# Altium footprint library myPcb.PcbLib: 80 footprints (part 5 of 5)
Each footprint in its own frame and in the unit in brackets; x right, y up, seen from the top. Pads: shape width x height; smd on the part's side, far side on the other; paste and mask are expansions set on the pad; w line width, h text height; cw(c..) or ccw(c..) is an arc to the next point about the centre after c.
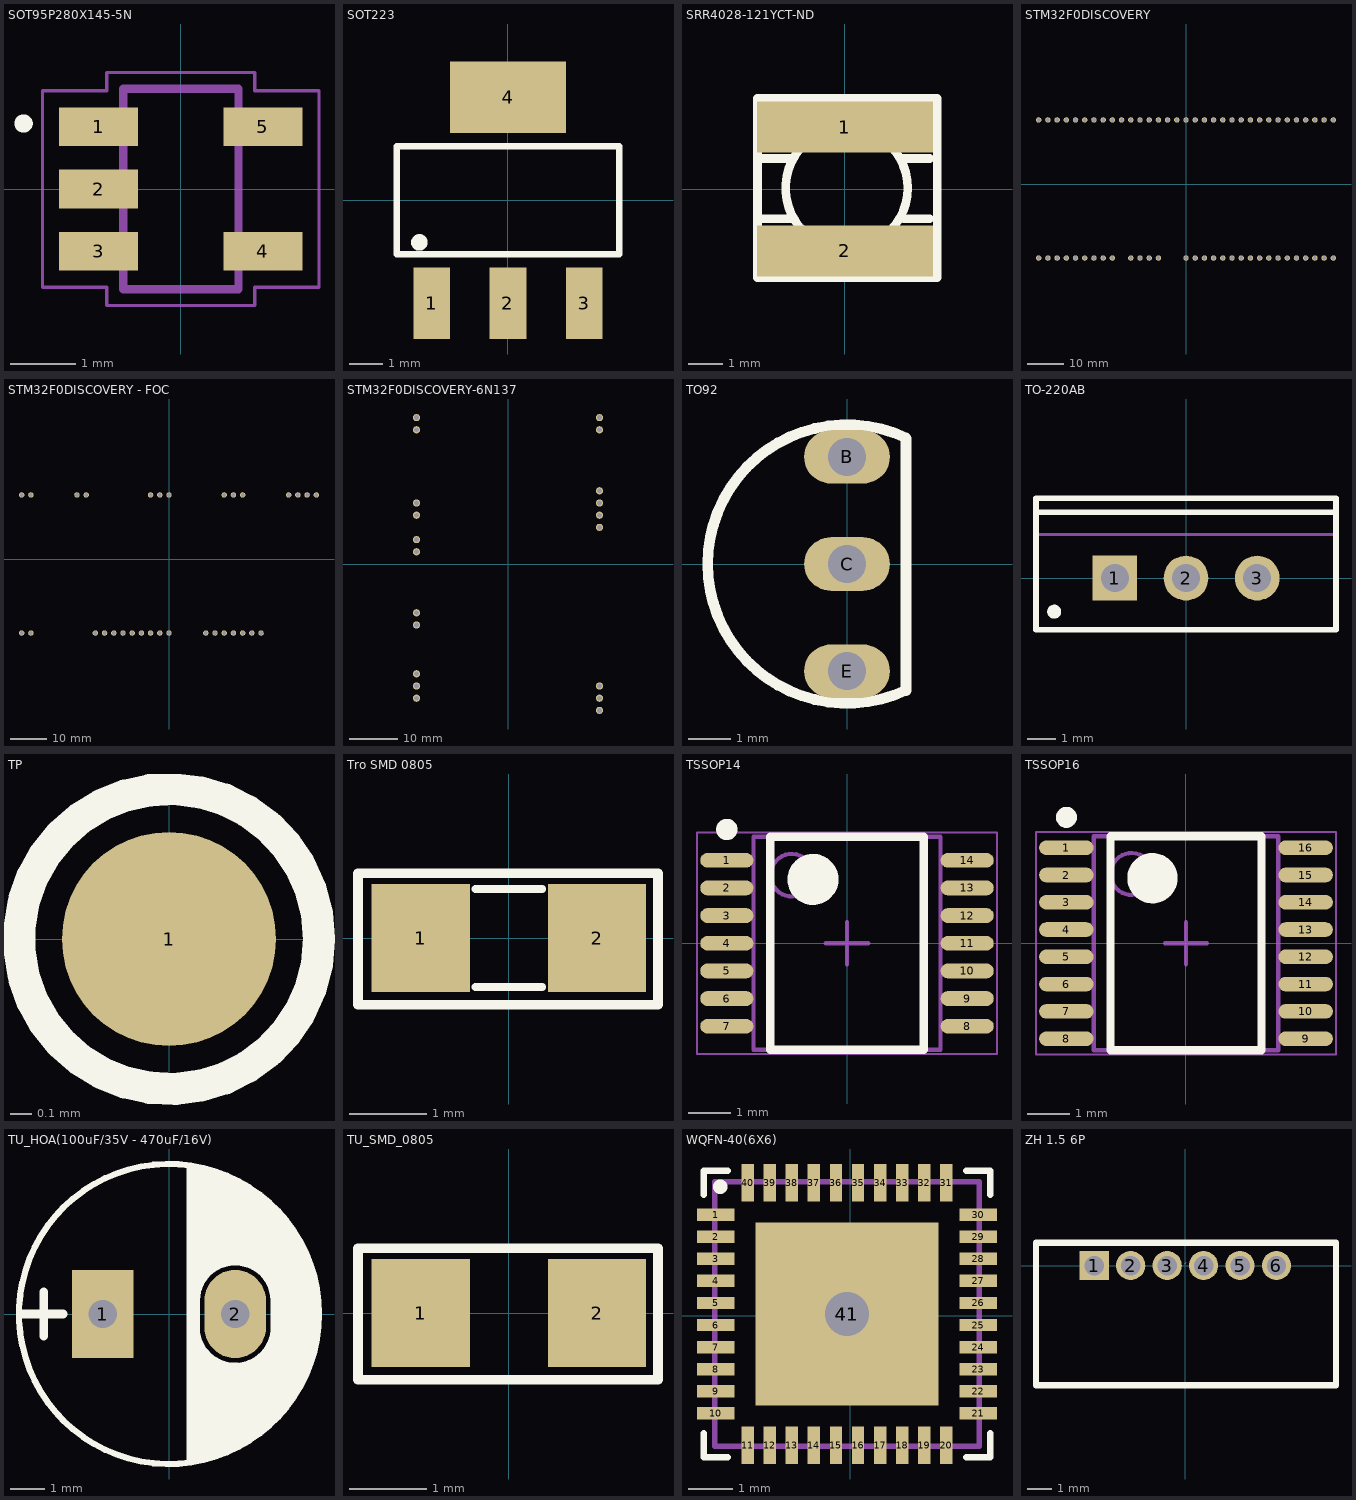
[diagram p4: the footprints below, top view; thin cyan lines are the x and y axes]

## SOT95P280X145-5N [mm]
pads (5):
  rect 1.21x0.59 smd: 1(-1.255,0.95) 2(-1.255,0) 3(-1.255,-0.95) 4(1.255,-0.95) 5(1.255,0.95)
Top Overlay:
  circle w0.14: c-2.4,1 r0.07
Mechanical 4:
  lines w0.127: -0.88,-1.53 -0.88,1.53 ; -0.88,-1.53 0.88,-1.53 ; -0.88,-1.53 -0.88,1.53 ; -0.88,-1.53 0.88,-1.53 ; -0.88,1.53 0.88,1.53 ; -0.88,1.53 0.88,1.53 ; 0.88,-1.53 0.88,1.53 ; 0.88,-1.53 0.88,1.53
Mechanical 16:
  lines w0.05: -2.11,-1.5 -2.11,1.5 -1.13,1.5 -1.13,1.78 1.13,1.78 1.13,1.5 2.11,1.5 2.11,-1.5 1.13,-1.5 1.13,-1.78 -1.13,-1.78 -1.13,-1.5 -2.11,-1.5
3D body: height 1.11, standoff 0.01, extent -1.275,-1.5 1.225,1.5

## SOT223 [mm] "SOT-223/SC-73; 4 Leads; Body 6.7 x 7.3 mm, inc. leads (LxW max)"
height 1.8
pads (4):
  rect 1.1x2.15 smd: 1(-2.3,-3.1) 2(0,-3.1) 3(2.3,-3.1)
  rect 3.5x2.15 smd: 4(0,3.1)
Top Overlay:
  circle w0.25: c-2.665,-1.27 r0.125
  lines w0.2: -3.35,-1.625 3.35,-1.625 3.35,1.625 -3.35,1.625 -3.35,-1.625
3D body: height 2.54, standoff 0, extent -3.429,-1.651 3.429,1.651

## SRR4028-121YCT-ND [mm]
pads (2):
  rect 5.2x1.5 smd: 1(0,1.825) 2(0,-1.825)
Top Overlay:
  circle w0.254: c0.05,0.025 r1.8
  lines w0.254: -2.58,-0.879 -1.564,-0.879 ; -2.58,0.899 -1.564,0.899 ; 1.738,-0.879 2.5,-0.879 ; 1.738,0.899 2.5,0.899 ; -2.58,-2.623 -2.58,2.677 2.72,2.677 2.72,-2.623 -2.58,-2.623
3D body: height 3, standoff 0, extent -2.654,-2.502 2.654,2.502

## STM32F0DISCOVERY [mm]
pads (63):
  round 1.5 hole 1: 1(-40.64,-20.32) 2(-38.1,-20.32) 3(-35.56,-20.32) 4(-33.02,-20.32) 5(-30.48,-20.32) 6(-27.94,-20.32) 7(-25.4,-20.32) 8(-22.86,-20.32) 9(-20.32,-20.32) 11(-15.24,-20.32) 12(-12.7,-20.32) 13(-10.16,-20.32) 14(-7.62,-20.32) 17(0,-20.32) 18(2.54,-20.32) 19(5.08,-20.32) 20(7.62,-20.32) 21(10.16,-20.32) 22(12.7,-20.32) 23(15.24,-20.32) 24(17.78,-20.32) 25(20.32,-20.32) 26(22.86,-20.32) 27(25.4,-20.32) 28(27.94,-20.32) 29(30.48,-20.32) 30(33.02,-20.32) 31(35.56,-20.32) 32(38.1,-20.32) 33(40.64,-20.32) 34(-40.64,17.78) 35(-38.1,17.78) 36(-35.56,17.78) 37(-33.02,17.78) 38(-30.48,17.78) 39(-27.94,17.78) 40(-25.4,17.78) 41(-22.86,17.78) 42(-20.32,17.78) 43(-17.78,17.78) 44(-15.24,17.78) 45(-12.7,17.78) 46(-10.16,17.78) 47(-7.62,17.78) 48(-5.08,17.78) 49(-2.54,17.78) 50(0,17.78) 51(2.54,17.78) 52(5.08,17.78) 53(7.62,17.78) 54(10.16,17.78) 55(12.7,17.78) 56(15.24,17.78) 57(17.78,17.78) 58(20.32,17.78) 59(22.86,17.78) 60(25.4,17.78) 61(27.94,17.78) 62(30.48,17.78) 63(33.02,17.78) 64(35.56,17.78) 65(38.1,17.78) 66(40.64,17.78)
3D body: height 1.5, standoff 0, extent -41.885,-21.59 -39.345,-19.05
3D body: height 7, standoff -1, extent -41.021,-20.726 -40.224,-19.928
3D body: height 1.5, standoff 0, extent -39.345,-21.59 -36.805,-19.05
3D body: height 7, standoff -1, extent -38.481,-20.726 -37.684,-19.928
3D body: height 1.5, standoff 0, extent -36.805,-21.59 -34.265,-19.05
3D body: height 7, standoff -1, extent -35.941,-20.726 -35.144,-19.928
3D body: height 1.5, standoff 0, extent -34.265,-21.59 -31.725,-19.05
3D body: height 7, standoff -1, extent -33.401,-20.726 -32.604,-19.928
3D body: height 7, standoff -1, extent -23.241,-20.726 -22.444,-19.928
3D body: height 1.5, standoff 0, extent -24.105,-21.59 -21.565,-19.05
3D body: height 7, standoff -1, extent -25.781,-20.726 -24.984,-19.928
3D body: height 1.5, standoff 0, extent -26.645,-21.59 -24.105,-19.05
3D body: height 7, standoff -1, extent -28.321,-20.726 -27.524,-19.928
3D body: height 1.5, standoff 0, extent -29.185,-21.59 -26.645,-19.05
3D body: height 7, standoff -1, extent -30.861,-20.726 -30.064,-19.928
3D body: height 1.5, standoff 0, extent -31.725,-21.59 -29.185,-19.05
3D body: height 1.5, standoff 0, extent -11.405,-21.59 -8.865,-19.05
3D body: height 7, standoff -1, extent -10.541,-20.726 -9.744,-19.928
3D body: height 1.5, standoff 0, extent -8.865,-21.59 -6.325,-19.05
3D body: height 7, standoff -1, extent -8.001,-20.726 -7.204,-19.928
3D body: height 7, standoff -1, extent -13.081,-20.726 -12.284,-19.928
3D body: height 1.5, standoff 0, extent -13.945,-21.59 -11.405,-19.05
3D body: height 7, standoff -1, extent -15.621,-20.726 -14.824,-19.928
3D body: height 1.5, standoff 0, extent -16.485,-21.59 -13.945,-19.05
3D body: height 7, standoff -1, extent -20.701,-20.726 -19.904,-19.928
3D body: height 1.5, standoff 0, extent -21.565,-21.59 -19.025,-19.05
3D body: height 1.5, standoff 0, extent 19.075,-21.59 21.615,-19.05
3D body: height 7, standoff -1, extent 19.939,-20.726 20.736,-19.928
3D body: height 1.5, standoff 0, extent 21.615,-21.59 24.155,-19.05
3D body: height 7, standoff -1, extent 22.479,-20.726 23.276,-19.928
3D body: height 1.5, standoff 0, extent 24.155,-21.59 26.695,-19.05
3D body: height 7, standoff -1, extent 25.019,-20.726 25.816,-19.928
3D body: height 1.5, standoff 0, extent 26.695,-21.59 29.235,-19.05
3D body: height 7, standoff -1, extent 27.559,-20.726 28.356,-19.928
3D body: height 7, standoff -1, extent 37.719,-20.726 38.516,-19.928
3D body: height 1.5, standoff 0, extent 36.855,-21.59 39.395,-19.05
3D body: height 7, standoff -1, extent 35.179,-20.726 35.976,-19.928
3D body: height 1.5, standoff 0, extent 34.315,-21.59 36.855,-19.05
3D body: height 7, standoff -1, extent 32.639,-20.726 33.436,-19.928
3D body: height 1.5, standoff 0, extent 31.775,-21.59 34.315,-19.05
3D body: height 7, standoff -1, extent 30.099,-20.726 30.896,-19.928
3D body: height 1.5, standoff 0, extent 29.235,-21.59 31.775,-19.05
3D body: height 1.5, standoff 0, extent 8.915,-21.59 11.455,-19.05
3D body: height 7, standoff -1, extent 9.779,-20.726 10.576,-19.928
3D body: height 1.5, standoff 0, extent 11.455,-21.59 13.995,-19.05
3D body: height 7, standoff -1, extent 12.319,-20.726 13.116,-19.928
3D body: height 1.5, standoff 0, extent 13.995,-21.59 16.535,-19.05
3D body: height 7, standoff -1, extent 14.859,-20.726 15.656,-19.928
3D body: height 1.5, standoff 0, extent 16.535,-21.59 19.075,-19.05
3D body: height 7, standoff -1, extent 17.399,-20.726 18.196,-19.928
3D body: height 7, standoff -1, extent 7.239,-20.726 8.036,-19.928
3D body: height 1.5, standoff 0, extent 6.375,-21.59 8.915,-19.05
3D body: height 7, standoff -1, extent 4.699,-20.726 5.496,-19.928
3D body: height 1.5, standoff 0, extent 3.835,-21.59 6.375,-19.05
3D body: height 7, standoff -1, extent 2.159,-20.726 2.956,-19.928
3D body: height 1.5, standoff 0, extent 1.295,-21.59 3.835,-19.05
3D body: height 7, standoff -1, extent -0.381,-20.726 0.416,-19.928
3D body: height 1.5, standoff 0, extent -1.245,-21.59 1.295,-19.05
3D body: height 1.5, standoff 0, extent 39.395,-21.59 41.935,-19.05
3D body: height 7, standoff -1, extent 40.259,-20.726 41.056,-19.928
3D body: height 1.5, standoff 0, extent -41.885,16.51 -39.345,19.05
3D body: height 7, standoff -1, extent -41.021,17.374 -40.224,18.172
3D body: height 1.5, standoff 0, extent -39.345,16.51 -36.805,19.05
3D body: height 7, standoff -1, extent -38.481,17.374 -37.684,18.172
3D body: height 1.5, standoff 0, extent -36.805,16.51 -34.265,19.05
3D body: height 7, standoff -1, extent -35.941,17.374 -35.144,18.172
3D body: height 1.5, standoff 0, extent -34.265,16.51 -31.725,19.05
3D body: height 7, standoff -1, extent -33.401,17.374 -32.604,18.172
3D body: height 7, standoff -1, extent -23.241,17.374 -22.444,18.172
3D body: height 1.5, standoff 0, extent -24.105,16.51 -21.565,19.05
3D body: height 7, standoff -1, extent -25.781,17.374 -24.984,18.172
3D body: height 1.5, standoff 0, extent -26.645,16.51 -24.105,19.05
3D body: height 7, standoff -1, extent -28.321,17.374 -27.524,18.172
3D body: height 1.5, standoff 0, extent -29.185,16.51 -26.645,19.05
3D body: height 7, standoff -1, extent -30.861,17.374 -30.064,18.172
3D body: height 1.5, standoff 0, extent -31.725,16.51 -29.185,19.05
3D body: height 1.5, standoff 0, extent -11.405,16.51 -8.865,19.05
3D body: height 7, standoff -1, extent -10.541,17.374 -9.744,18.172
3D body: height 1.5, standoff 0, extent -8.865,16.51 -6.325,19.05
3D body: height 7, standoff -1, extent -8.001,17.374 -7.204,18.172
3D body: height 1.5, standoff 0, extent -6.325,16.51 -3.785,19.05
3D body: height 7, standoff -1, extent -5.461,17.374 -4.664,18.172
3D body: height 1.5, standoff 0, extent -3.785,16.51 -1.245,19.05
3D body: height 7, standoff -1, extent -2.921,17.374 -2.124,18.172
3D body: height 7, standoff -1, extent -13.081,17.374 -12.284,18.172
3D body: height 1.5, standoff 0, extent -13.945,16.51 -11.405,19.05
3D body: height 7, standoff -1, extent -15.621,17.374 -14.824,18.172
3D body: height 1.5, standoff 0, extent -16.485,16.51 -13.945,19.05
3D body: height 7, standoff -1, extent -18.161,17.374 -17.364,18.172
3D body: height 1.5, standoff 0, extent -19.025,16.51 -16.485,19.05
3D body: height 7, standoff -1, extent -20.701,17.374 -19.904,18.172
3D body: height 1.5, standoff 0, extent -21.565,16.51 -19.025,19.05
3D body: height 1.5, standoff 0, extent 19.075,16.51 21.615,19.05
3D body: height 7, standoff -1, extent 19.939,17.374 20.736,18.172
3D body: height 1.5, standoff 0, extent 21.615,16.51 24.155,19.05
3D body: height 7, standoff -1, extent 22.479,17.374 23.276,18.172
3D body: height 1.5, standoff 0, extent 24.155,16.51 26.695,19.05
3D body: height 7, standoff -1, extent 25.019,17.374 25.816,18.172
3D body: height 1.5, standoff 0, extent 26.695,16.51 29.235,19.05
3D body: height 7, standoff -1, extent 27.559,17.374 28.356,18.172
3D body: height 7, standoff -1, extent 37.719,17.374 38.516,18.172
3D body: height 1.5, standoff 0, extent 36.855,16.51 39.395,19.05
3D body: height 7, standoff -1, extent 35.179,17.374 35.976,18.172
3D body: height 1.5, standoff 0, extent 34.315,16.51 36.855,19.05
3D body: height 7, standoff -1, extent 32.639,17.374 33.436,18.172
3D body: height 1.5, standoff 0, extent 31.775,16.51 34.315,19.05
3D body: height 7, standoff -1, extent 30.099,17.374 30.896,18.172
3D body: height 1.5, standoff 0, extent 29.235,16.51 31.775,19.05
3D body: height 1.5, standoff 0, extent 8.915,16.51 11.455,19.05
3D body: height 7, standoff -1, extent 9.779,17.374 10.576,18.172
3D body: height 1.5, standoff 0, extent 11.455,16.51 13.995,19.05
3D body: height 7, standoff -1, extent 12.319,17.374 13.116,18.172
3D body: height 1.5, standoff 0, extent 13.995,16.51 16.535,19.05
3D body: height 7, standoff -1, extent 14.859,17.374 15.656,18.172
3D body: height 1.5, standoff 0, extent 16.535,16.51 19.075,19.05
3D body: height 7, standoff -1, extent 17.399,17.374 18.196,18.172
3D body: height 7, standoff -1, extent 7.239,17.374 8.036,18.172
3D body: height 1.5, standoff 0, extent 6.375,16.51 8.915,19.05
3D body: height 7, standoff -1, extent 4.699,17.374 5.496,18.172
3D body: height 1.5, standoff 0, extent 3.835,16.51 6.375,19.05
3D body: height 7, standoff -1, extent 2.159,17.374 2.956,18.172
3D body: height 1.5, standoff 0, extent 1.295,16.51 3.835,19.05
3D body: height 7, standoff -1, extent -0.381,17.374 0.416,18.172
3D body: height 1.5, standoff 0, extent -1.245,16.51 1.295,19.05
3D body: height 1.5, standoff 0, extent 39.395,16.51 41.935,19.05
3D body: height 7, standoff -1, extent 40.259,17.374 41.056,18.172

## STM32F0DISCOVERY - FOC [mm]
pads (32):
  round 1.5 hole 1: 1(-40.64,-20.32) 2(-38.1,-20.32) 9(-20.32,-20.32) 10(-17.78,-20.32) 11(-15.24,-20.32) 12(-12.7,-20.32) 13(-10.16,-20.32) 14(-7.62,-20.32) 15(-5.08,-20.32) 16(-2.54,-20.32) 17(0,-20.32) 21(10.16,-20.32) 22(12.7,-20.32) 23(15.24,-20.32) 24(17.78,-20.32) 25(20.32,-20.32) 26(22.86,-20.32) 27(25.4,-20.32) 34(-40.64,17.78) 35(-38.1,17.78) 40(-25.4,17.78) 41(-22.86,17.78) 48(-5.08,17.78) 49(-2.54,17.78) 50(0,17.78) 56(15.24,17.78) 57(17.78,17.78) 58(20.32,17.78) 63(33.02,17.78) 64(35.56,17.78) 65(38.1,17.78) 66(40.64,17.78)
3D body: height 1.5, standoff 0, extent -1.245,16.51 1.295,19.05
3D body: height 7, standoff -1, extent -0.381,17.374 0.416,18.172
3D body: height 1.5, standoff 0, extent -6.325,16.51 -3.785,19.05
3D body: height 7, standoff -1, extent -5.461,17.374 -4.664,18.172
3D body: height 7, standoff -1, extent 40.259,17.374 41.056,18.172
3D body: height 1.5, standoff 0, extent 39.395,16.51 41.935,19.05
3D body: height 7, standoff -1, extent 17.399,17.374 18.196,18.172
3D body: height 1.5, standoff 0, extent 16.535,16.51 19.075,19.05
3D body: height 7, standoff -1, extent 14.859,17.374 15.656,18.172
3D body: height 1.5, standoff 0, extent 13.995,16.51 16.535,19.05
3D body: height 1.5, standoff 0, extent 31.775,16.51 34.315,19.05
3D body: height 7, standoff -1, extent 32.639,17.374 33.436,18.172
3D body: height 1.5, standoff 0, extent 34.315,16.51 36.855,19.05
3D body: height 7, standoff -1, extent 35.179,17.374 35.976,18.172
3D body: height 1.5, standoff 0, extent 36.855,16.51 39.395,19.05
3D body: height 7, standoff -1, extent 37.719,17.374 38.516,18.172
3D body: height 7, standoff -1, extent 19.939,17.374 20.736,18.172
3D body: height 1.5, standoff 0, extent 19.075,16.51 21.615,19.05
3D body: height 7, standoff -1, extent -2.921,17.374 -2.124,18.172
3D body: height 1.5, standoff 0, extent -3.785,16.51 -1.245,19.05
3D body: height 1.5, standoff 0, extent -26.645,16.51 -24.105,19.05
3D body: height 7, standoff -1, extent -25.781,17.374 -24.984,18.172
3D body: height 1.5, standoff 0, extent -24.105,16.51 -21.565,19.05
3D body: height 7, standoff -1, extent -23.241,17.374 -22.444,18.172
3D body: height 7, standoff -1, extent -38.481,17.374 -37.684,18.172
3D body: height 1.5, standoff 0, extent -39.345,16.51 -36.805,19.05
3D body: height 7, standoff -1, extent -41.021,17.374 -40.224,18.172
3D body: height 1.5, standoff 0, extent -41.885,16.51 -39.345,19.05
3D body: height 1.5, standoff 0, extent -1.245,-21.59 1.295,-19.05
3D body: height 7, standoff -1, extent -0.381,-20.726 0.416,-19.928
3D body: height 7, standoff -1, extent 17.399,-20.726 18.196,-19.928
3D body: height 1.5, standoff 0, extent 16.535,-21.59 19.075,-19.05
3D body: height 7, standoff -1, extent 14.859,-20.726 15.656,-19.928
3D body: height 1.5, standoff 0, extent 13.995,-21.59 16.535,-19.05
3D body: height 7, standoff -1, extent 12.319,-20.726 13.116,-19.928
3D body: height 1.5, standoff 0, extent 11.455,-21.59 13.995,-19.05
3D body: height 7, standoff -1, extent 9.779,-20.726 10.576,-19.928
3D body: height 1.5, standoff 0, extent 8.915,-21.59 11.455,-19.05
3D body: height 7, standoff -1, extent 25.019,-20.726 25.816,-19.928
3D body: height 1.5, standoff 0, extent 24.155,-21.59 26.695,-19.05
3D body: height 7, standoff -1, extent 22.479,-20.726 23.276,-19.928
3D body: height 1.5, standoff 0, extent 21.615,-21.59 24.155,-19.05
3D body: height 7, standoff -1, extent 19.939,-20.726 20.736,-19.928
3D body: height 1.5, standoff 0, extent 19.075,-21.59 21.615,-19.05
3D body: height 1.5, standoff 0, extent -21.565,-21.59 -19.025,-19.05
3D body: height 7, standoff -1, extent -20.701,-20.726 -19.904,-19.928
3D body: height 1.5, standoff 0, extent -16.485,-21.59 -13.945,-19.05
3D body: height 7, standoff -1, extent -15.621,-20.726 -14.824,-19.928
3D body: height 1.5, standoff 0, extent -13.945,-21.59 -11.405,-19.05
3D body: height 7, standoff -1, extent -13.081,-20.726 -12.284,-19.928
3D body: height 7, standoff -1, extent -2.921,-20.726 -2.124,-19.928
3D body: height 1.5, standoff 0, extent -3.785,-21.59 -1.245,-19.05
3D body: height 7, standoff -1, extent -5.461,-20.726 -4.664,-19.928
3D body: height 1.5, standoff 0, extent -6.325,-21.59 -3.785,-19.05
3D body: height 7, standoff -1, extent -8.001,-20.726 -7.204,-19.928
3D body: height 1.5, standoff 0, extent -8.865,-21.59 -6.325,-19.05
3D body: height 7, standoff -1, extent -10.541,-20.726 -9.744,-19.928
3D body: height 1.5, standoff 0, extent -11.405,-21.59 -8.865,-19.05
3D body: height 7, standoff -1, extent -38.481,-20.726 -37.684,-19.928
3D body: height 1.5, standoff 0, extent -39.345,-21.59 -36.805,-19.05
3D body: height 7, standoff -1, extent -41.021,-20.726 -40.224,-19.928
3D body: height 1.5, standoff 0, extent -41.885,-21.59 -39.345,-19.05
3D body: height 7, standoff -1, extent -18.161,-20.726 -17.364,-19.928
3D body: height 1.5, standoff 0, extent -19.025,-21.59 -16.485,-19.05

## STM32F0DISCOVERY-6N137 [mm]
pads (20):
  round 1.5 hole 1: 1(-19.05,30.48) 2(-19.05,27.94) 8(-19.05,12.7) 9(-19.05,10.16) 11(-19.05,5.08) 12(-19.05,2.54) 17(-19.05,-10.16) 18(-19.05,-12.7) 22(-19.05,-22.86) 23(-19.05,-25.4) 24(-19.05,-27.94) 34(19.05,30.48) 35(19.05,27.94) 40(19.05,15.24) 41(19.05,12.7) 42(19.05,10.16) 43(19.05,7.62) 56(19.05,-25.4) 57(19.05,-27.94) 58(19.05,-30.48)
3D body: height 7, standoff -1, extent 18.644,-28.356 19.442,-27.559
3D body: height 1.5, standoff 0, extent 17.78,-29.235 20.32,-26.695
3D body: height 7, standoff -1, extent 18.644,-25.816 19.442,-25.019
3D body: height 1.5, standoff 0, extent 17.78,-26.695 20.32,-24.155
3D body: height 7, standoff -1, extent 18.644,-30.896 19.442,-30.099
3D body: height 1.5, standoff 0, extent 17.78,-31.775 20.32,-29.235
3D body: height 1.5, standoff 0, extent 17.78,8.865 20.32,11.405
3D body: height 7, standoff -1, extent 18.644,9.744 19.442,10.541
3D body: height 1.5, standoff 0, extent 17.78,6.325 20.32,8.865
3D body: height 7, standoff -1, extent 18.644,7.204 19.442,8.001
3D body: height 1.5, standoff 0, extent 17.78,13.945 20.32,16.485
3D body: height 7, standoff -1, extent 18.644,14.824 19.442,15.621
3D body: height 1.5, standoff 0, extent 17.78,11.405 20.32,13.945
3D body: height 7, standoff -1, extent 18.644,12.284 19.442,13.081
3D body: height 7, standoff -1, extent 18.644,27.524 19.442,28.321
3D body: height 1.5, standoff 0, extent 17.78,26.645 20.32,29.185
3D body: height 7, standoff -1, extent 18.644,30.064 19.442,30.861
3D body: height 1.5, standoff 0, extent 17.78,29.185 20.32,31.725
3D body: height 1.5, standoff 0, extent -20.32,-11.455 -17.78,-8.915
3D body: height 7, standoff -1, extent -19.456,-10.576 -18.658,-9.779
3D body: height 1.5, standoff 0, extent -20.32,-13.995 -17.78,-11.455
3D body: height 7, standoff -1, extent -19.456,-13.116 -18.658,-12.319
3D body: height 7, standoff -1, extent -19.456,-28.356 -18.658,-27.559
3D body: height 1.5, standoff 0, extent -20.32,-29.235 -17.78,-26.695
3D body: height 7, standoff -1, extent -19.456,-25.816 -18.658,-25.019
3D body: height 1.5, standoff 0, extent -20.32,-26.695 -17.78,-24.155
3D body: height 7, standoff -1, extent -19.456,-23.276 -18.658,-22.479
3D body: height 1.5, standoff 0, extent -20.32,-24.155 -17.78,-21.615
3D body: height 1.5, standoff 0, extent -20.32,8.865 -17.78,11.405
3D body: height 7, standoff -1, extent -19.456,9.744 -18.658,10.541
3D body: height 1.5, standoff 0, extent -20.32,3.785 -17.78,6.325
3D body: height 7, standoff -1, extent -19.456,4.664 -18.658,5.461
3D body: height 1.5, standoff 0, extent -20.32,1.245 -17.78,3.785
3D body: height 7, standoff -1, extent -19.456,2.124 -18.658,2.921
3D body: height 7, standoff -1, extent -19.456,27.524 -18.658,28.321
3D body: height 1.5, standoff 0, extent -20.32,26.645 -17.78,29.185
3D body: height 7, standoff -1, extent -19.456,30.064 -18.658,30.861
3D body: height 1.5, standoff 0, extent -20.32,29.185 -17.78,31.725
3D body: height 7, standoff -1, extent -19.456,12.284 -18.658,13.081
3D body: height 1.5, standoff 0, extent -20.32,11.405 -17.78,13.945

## TO92 [mm] "TO, Flat Index; 3 In-Line, Axial Leads; Body Dia. 4.8mm"
pads (3):
  oval 2.032x1.27 hole 0.9: B(0,2.54) C(0,0) E(0,-2.54)
Top Overlay:
  lines w0.254: 1.395,-2.993 cw(c0,0) 1.395,2.993 ; 1.397,-2.997 1.397,2.972
3D body: height 8.53, standoff -2.77, extent -2.528,-2.765 1.55,2.765

## TO-220AB [mm] "TO, Thru-Hole, Vertical, Heatsink Mounted; 3 In-Line Leads; Pitch 2.54 mm"
height 19.3
pads (3):
  rect 1.6x1.6 hole 1: 1(-2.54,0)
  round 1.6 hole 1: 2(0,0) 3(2.54,0)
Top Overlay:
  circle w0.25: c-4.7,-1.2 r0.125
  lines w0.2: -5.35,2.35 5.35,2.35 ; -5.35,-1.85 5.35,-1.85 5.35,2.85 -5.35,2.85 -5.35,-1.85
Mechanical 13:
  lines w0.1: -5.35,1.55 5.35,1.55 ; -5.35,-1.85 -5.35,2.85 5.35,2.85 5.35,-1.85 -5.35,-1.85
Mechanical 15:
  lines w0.1: -0.5,0 0.5,0 ; 0,-0.5 0,0.5
3D body: height 19.3, standoff 12.9, extent -5.349,1.551 5.349,2.849
3D body: height 12.9, standoff 4, extent -5.4,-1.9 5.4,2.9

## TP [mm]
pads (1):
  round 1 smd paste-5: 1(0,0)
Top Overlay:
  circle w0.15: c0,0 r0.7

## Tro SMD 0805 [mil]
pads (2):
  rect 50x55 smd: 1(-45,0) 2(45,0)
Top Overlay:
  lines w4: -17,-25 17,-25 ; -17,25 17,25
  lines w5: -77,-34 76,-34 76,33 -77,33 -77,-34
3D body: height 28.43, standoff -1.49, extent -45.27,-26.57 45.28,26.58

## TSSOP14 [mm] "TSSOP, 14-Leads, Body 5.00x4.40mm, Pitch 0.65mm, IPC High Density"
height 1
pads (14):
  oval 1.25x0.35 smd: 1(-2.825,1.95) 2(-2.825,1.3) 3(-2.825,0.65) 4(-2.825,0) 5(-2.825,-0.65) 6(-2.825,-1.3) 7(-2.825,-1.95) 8(2.825,-1.95) 9(2.825,-1.3) 10(2.825,-0.65) 11(2.825,0) 12(2.825,0.65) 13(2.825,1.3) 14(2.825,1.95)
Top Overlay:
  circle w0.25: c-2.825,2.675 r0.125
  circle w0.6: c-0.8,1.5 r0.3
  lines w0.2: -1.8,-2.5 -1.8,2.5 1.8,2.5 1.8,-2.5 -1.8,-2.5
Mechanical 13:
  circle w0.1: c-1.3,1.6 r0.5
  lines w0.1: -2.2,-2.5 -2.2,2.5 2.2,2.5 2.2,-2.5 -2.2,-2.5
Mechanical 15:
  lines w0.05: -3.525,-2.6 -3.525,2.6 3.525,2.6 3.525,-2.6 -3.525,-2.6
  lines w0.1: -0.5,0 0.5,0 ; 0,-0.5 0,0.5
3D body: height 1.25, standoff 0, extent -3.228,-2.55 3.228,2.55

## TSSOP16 [mm] "TSSOP, 16-Leads, Body 5.10x4.40mm, Pitch 0.65mm, IPC High Density"
height 1.2
pads (16):
  oval 1.3x0.35 smd: 1(-2.85,2.275) 2(-2.85,1.625) 3(-2.85,0.975) 4(-2.85,0.325) 5(-2.85,-0.325) 6(-2.85,-0.975) 7(-2.85,-1.625) 8(-2.85,-2.275) 9(2.85,-2.275) 10(2.85,-1.625) 11(2.85,-0.975) 12(2.85,-0.325) 13(2.85,0.325) 14(2.85,0.975) 15(2.85,1.625) 16(2.85,2.275)
Top Overlay:
  circle w0.6: c-0.8,1.55 r0.3
  circle w0.25: c-2.85,3 r0.125
  lines w0.2: -1.8,-2.55 1.8,-2.55 1.8,2.55 -1.8,2.55 -1.8,-2.55
Mechanical 13:
  circle w0.1: c-1.3,1.65 r0.5
  lines w0.1: -2.2,-2.55 2.2,-2.55 2.2,2.55 -2.2,2.55 -2.2,-2.55
Mechanical 15:
  lines w0.05: -3.575,-2.65 3.575,-2.65 3.575,2.65 -3.575,2.65 -3.575,-2.65
  lines w0.1: -0.5,0 0.5,0 ; 0,-0.5 0,0.5
3D body: height 1.25, standoff 0, extent -3.228,-2.53 3.228,2.57

## TU_HOA(100uF/35V - 470uF/16V) [mil]
pads (2):
  rect 70x100 hole 32: 1(-75,0)
  oval 70x100 hole 32: 2(75,0)
Top Overlay:
  circle w7: c0,0 r170
  region: 25,25 60,60 87.93,60.33 94.59,59.01 100.24,55.24 100,55 106.63,48.7 109.3,44.71 110.24,40 110,40 115.24,35.24 119.01,29.59 120.33,22.93 120,22.93 120.33,-27.93 119.01,-34.59 115.24,-40.24 115,-40 103.7,-51.63 99.71,-54.3 95,-55.24 95.24,-55.24 89.59,-59.01 82.93,-60.33 82.93,-60 69.14,-60.29 60.23,-59.12 51.92,-55.68 44.79,-50.21 45,-50 33.37,-38.7 30.7,-34.71 29.76,-30 30,-30 25,-30 25,-170 80,-150 120,-120 150,-80 170,-20 170,20 155,70 125,115 90,145 45,165 25,170
  lines w10: -165,0 -120,0 ; -142,-25 -142,25 ; 25,-165 25,165 ; 25,25 30,25 ; 30,-20 30,30 ; 30,-10 ccw(c75,-15) 70,-60 ccw(c75,-15) 120,-20 120,15 ccw(c75,15) 75,60 ccw(c75,15) 30,15
3D body: height 445.89, standoff -754.41, extent -159.96,-157.48 155,157.48

## TU_SMD_0805 [mil]
height 50
pads (2):
  rect 50x55 smd: 1(-45,0) 2(45,0)
Top Overlay:
  lines w5: -77,-34 76,-34 76,33 -77,33 -77,-34
3D body: height 24.02, standoff -0.39, extent -39.76,-25 39.77,25

## WQFN-40(6X6) [mil]
pads (42):
  rect 33.4x11 smd: 1(-120,90) 2(-120,70.31) 3(-120,50.63) 6(-120,-8.43) 7(-120,-28.11) 8(-120,-47.8) 9(-120,-67.48) 10(-120,-87.17)
  rect 33.4x11.1 smd: 4(-120,30.94) 5(-120,11.26)
  rect 11.1x33.4 smd: 11(-91.46,-115.71) 17(26.65,-115.71) 18(46.34,-115.71)
  rect 11x33.4 smd: 12(-71.77,-115.71) 13(-52.09,-115.71) 14(-32.4,-115.71) 15(-12.72,-115.71) 16(6.97,-115.71) 19(66.02,-115.71) 20(85.71,-115.71)
  rect 33.5x11 smd: 21(114.25,-87.17) 22(114.25,-67.48) 23(114.25,-47.8) 24(114.25,-28.11) 25(114.25,-8.43) 28(114.25,50.63) 29(114.25,70.31) 30(114.25,90)
  rect 33.5x11.1 smd: 26(114.25,11.26) 27(114.25,30.94)
  rect 11x33.5 smd: 31(85.71,118.54) 32(66.02,118.54) 35(6.97,118.54) 36(-12.72,118.54) 37(-32.4,118.54) 38(-52.09,118.54) 39(-71.77,118.54)
  rect 11.1x33.5 smd: 33(46.34,118.54) 34(26.65,118.54) 40(-91.46,118.54)
  rect 163.39x163.39 smd: 41(-2.87,1.42)
  round 59.06 hole 39.37: 41(-2.87,1.42)
Top Overlay:
  circle w10: c-116,115 r1.41
  lines w5.91: -130.77,-104.88 -130.77,-126.48 -109.17,-126.48 ; -130.77,107.72 -130.77,129.42 -109.17,129.42 ; 103.43,-126.48 125.13,-126.48 125.13,-104.88 ; 103.43,129.42 125.13,129.42 125.13,107.72
Mechanical 15:
  lines w5: -120.97,-116.68 -120.97,119.52 115.23,119.52 115.23,-116.68 -120.97,-116.68
3D body: height 39.76, standoff 19.68, extent -91.83,71.43 -67.78,95.47
3D body: height 31.98, standoff 0.48, extent -120.98,-116.68 115.24,119.54

## ZH 1.5 6P [mm]
pads (6):
  rect 1.2x1.2 hole 0.8: 1(-3.749,0)
  round 1.2 hole 0.8: 2(-2.25,0) 3(-0.749,0) 4(0.749,0) 5(2.25,0) 6(3.749,0)
Top Overlay:
  lines w0.254: -6.147,-4.928 -6.147,0.94 6.198,0.94 6.198,-4.928 -6.147,-4.928
Mechanical 15:
  lines w0.003: -0.025,0.077 0.025,0.128
3D body: height 3.71, standoff -1.49, extent -5.962,-4.75 6.038,0.25